# Altium footprint library Selex_PCBLib.PcbLib: 388 footprints (part 9 of 25)
Each footprint in its own frame and in the unit in brackets; x right, y up, seen from the top. Pads: shape width x height; smd on the part's side, far side on the other; paste and mask are expansions set on the pad; w line width, h text height; cw(c..) or ccw(c..) is an arc to the next point about the centre after c.
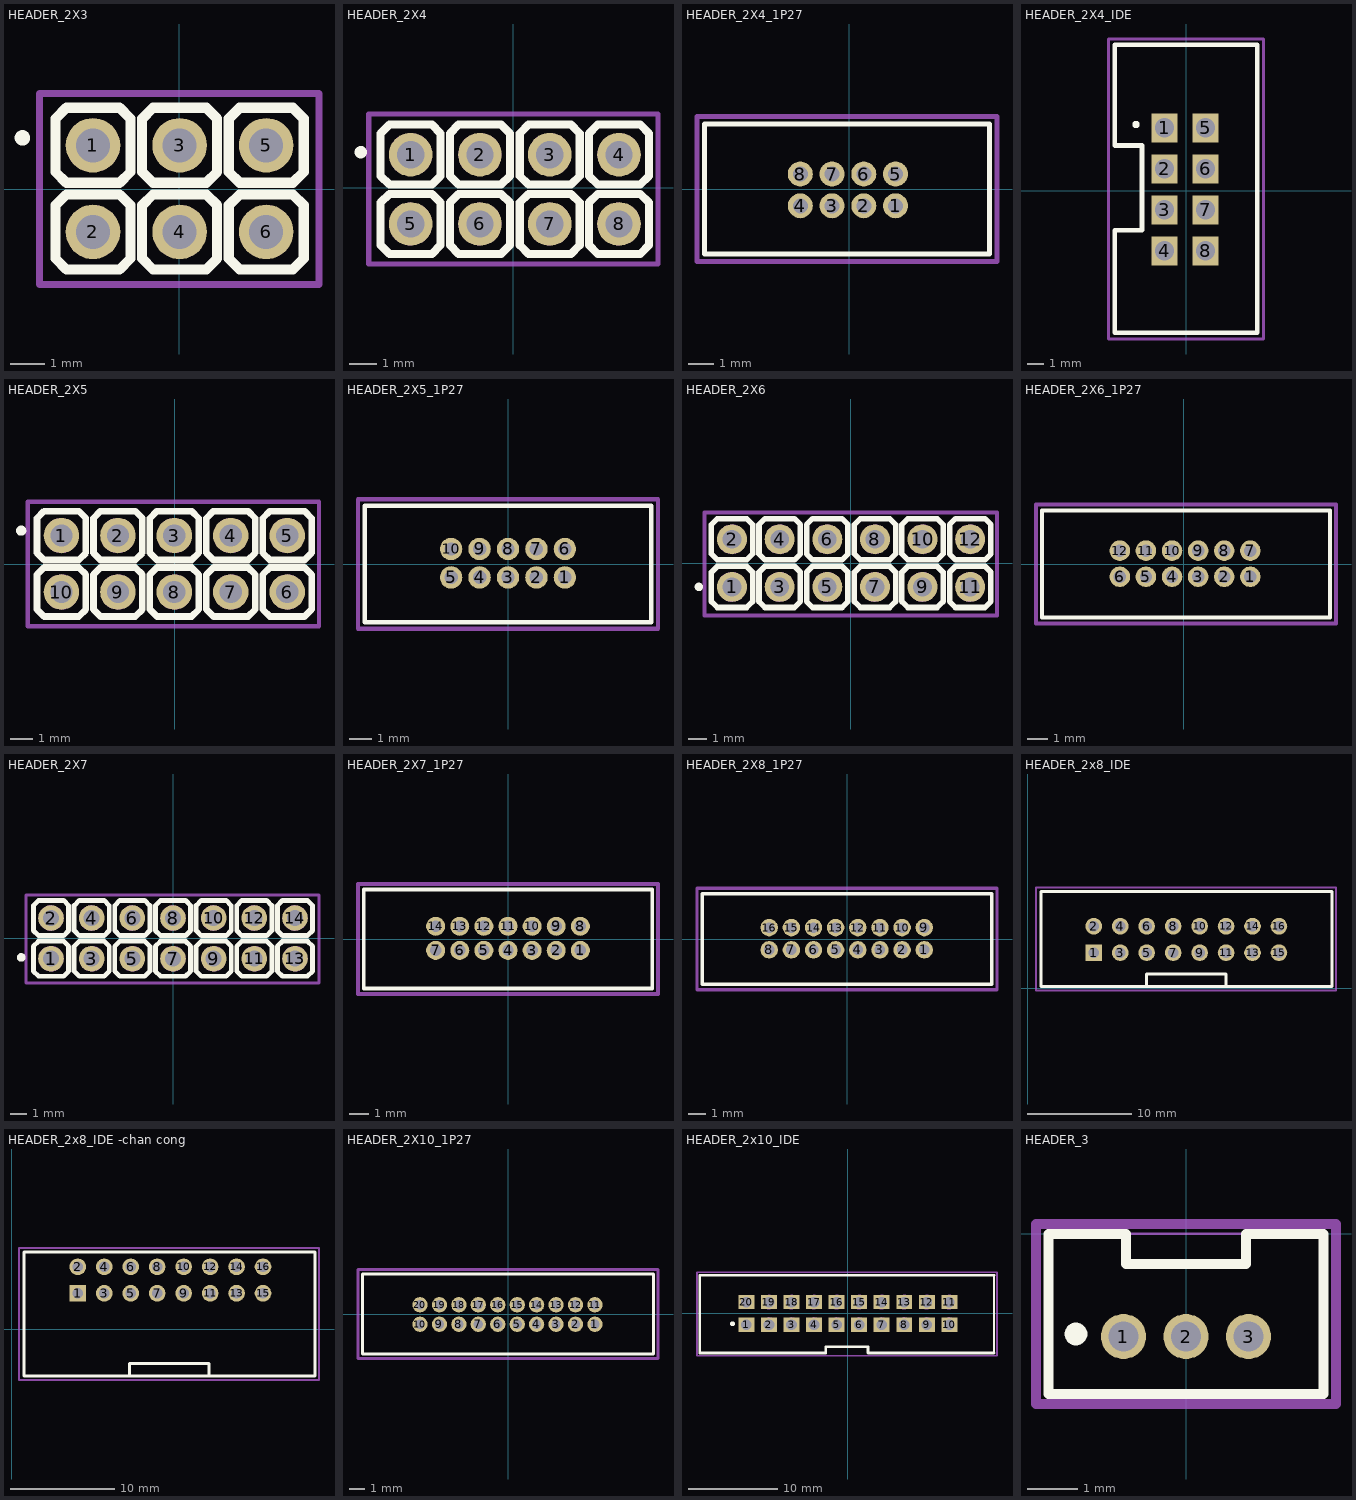
[diagram p8: the footprints below, top view; thin cyan lines are the x and y axes]

## HEADER_2X3 [mm] "2X3_2P54"
pads (6):
  round 1.6 hole 1 mask+0.1: 1(-2.53,1.28) 2(-2.53,-1.26) 3(0.01,1.28) 4(0.01,-1.26) 5(2.55,1.28) 6(2.55,-1.26)
Top Overlay:
  circle w0.254: c-4.6,1.5 r0.1
  lines w0.3: -1.09,0.5 -0.77,0.18 ; -1.09,0.5 -0.77,0.18 ; -1.09,0.5 -1.09,2.06 -0.77,2.38 0.79,2.38 1.11,2.06 1.11,0.5 0.79,0.18 -0.77,0.18 ; -3.63,-2.04 -3.63,-0.48 -3.31,-0.16 -1.75,-0.16 -1.43,-0.48 -1.43,-2.04 -1.75,-2.36 -3.31,-2.36 -3.63,-2.04 ; -3.63,0.5 -3.63,2.06 -3.31,2.38 -1.75,2.38 -1.43,2.06 -1.43,0.5 -1.75,0.18 -3.31,0.18 -3.63,0.5 ; -1.09,-2.04 -1.09,-0.48 -0.77,-0.16 0.79,-0.16 1.11,-0.48 1.11,-2.04 0.79,-2.36 -0.77,-2.36 -1.09,-2.04 ; 1.45,-2.04 1.45,-0.48 1.77,-0.16 3.33,-0.16 3.65,-0.48 3.65,-2.04 3.33,-2.36 1.77,-2.36 1.45,-2.04 ; 1.45,0.5 1.45,2.06 1.77,2.38 3.33,2.38 3.65,2.06 3.65,0.5 3.33,0.18 1.77,0.18 1.45,0.5
Mechanical 1:
  circle w0.05: c-2.53,1.28 r0.762
  circle w0.05: c0.01,1.28 r0.762
  circle w0.05: c-2.53,-1.26 r0.762
  circle w0.05: c0.01,-1.26 r0.762
  circle w0.05: c2.55,1.28 r0.762
  circle w0.05: c2.55,-1.26 r0.762
  lines w0.05: -1.09,0.5 -0.77,0.18 ; -1.09,0.5 -1.09,2.06 ; -1.09,0.5 -1.09,2.06 ; -1.09,0.5 -0.77,0.18 ; -1.09,2.06 -0.77,2.38 ; -1.09,2.06 -0.77,2.38 ; -0.77,0.18 0.79,0.18 ; -0.77,0.18 0.79,0.18 ; -0.77,2.38 0.79,2.38 ; -0.77,2.38 0.79,2.38 ; 0.79,0.18 1.11,0.5 ; 0.79,0.18 1.11,0.5 ; 0.79,2.38 1.11,2.06 ; 0.79,2.38 1.11,2.06 ; 1.11,0.5 1.11,2.06 ; 1.11,0.5 1.11,2.06 ; 1.45,0.5 1.45,2.06 ; 1.45,0.5 1.77,0.18 ; 1.45,0.5 1.77,0.18 ; 1.45,0.5 1.45,2.06 ; 1.45,2.06 1.77,2.38 ; 1.45,2.06 1.77,2.38 ; 1.77,0.18 3.33,0.18 ; 1.77,0.18 3.33,0.18 ; 1.77,2.38 3.33,2.38 ; 1.77,2.38 3.33,2.38 ; 3.33,0.18 3.65,0.5 ; 3.33,0.18 3.65,0.5 ; 3.33,2.38 3.65,2.06 ; 3.33,2.38 3.65,2.06 ; 3.65,0.5 3.65,2.06 ; 3.65,0.5 3.65,2.06 ; -3.63,-2.04 -3.31,-2.36 -1.75,-2.36 -1.43,-2.04 -1.43,-0.48 -1.75,-0.16 -3.31,-0.16 -3.63,-0.48 -3.63,-2.04 ; -3.63,0.5 -3.31,0.18 -1.75,0.18 -1.43,0.5 -1.43,2.06 -1.75,2.38 -3.31,2.38 -3.63,2.06 -3.63,0.5 ; -1.09,-2.04 -0.77,-2.36 0.79,-2.36 1.11,-2.04 1.11,-0.48 0.79,-0.16 -0.77,-0.16 -1.09,-0.48 -1.09,-2.04 ; 1.45,-2.04 1.77,-2.36 3.33,-2.36 3.65,-2.04 3.65,-0.48 3.33,-0.16 1.77,-0.16 1.45,-0.48 1.45,-2.04
  text "4" at -0.26,-1.64 h0.8
  text "2" at -2.76,-1.64 h0.8
  text "1" at -2.66,0.91 h0.8
  text "3" at -0.21,0.91 h0.8
  text "5" at 2.33,0.91 h0.8
  text "6" at 2.33,-1.63 h0.8
Mechanical 15:
  lines w0.2: -4.1,-2.8 4.1,-2.8 4.1,-1.325 4.1,2.8 -4.1,2.8 -4.1,-2.8
3D body "HEADER1.step": height 5.94, standoff -2.94, extent -3.83,-0.02 -1.29,2.52
3D body "HEADER1.step": height 5.94, standoff -2.94, extent -1.29,-0.02 1.25,2.52
3D body "HEADER1.step": height 5.94, standoff -2.94, extent -3.83,-2.56 -1.29,-0.02
3D body "HEADER1.step": height 5.94, standoff -2.94, extent -1.29,-2.56 1.25,-0.02
3D body "HEADER1.step": height 5.94, standoff -2.94, extent 1.25,-0.02 3.79,2.52
3D body "HEADER1.step": height 5.94, standoff -2.94, extent 1.25,-0.02 3.79,2.52
3D body "HEADER1.step": height 5.94, standoff -2.94, extent 1.25,-2.56 3.79,-0.02

## HEADER_2X4 [mm] "HEADER_2X4_2P54"
pads (8):
  round 1.6 hole 1 mask+0.1: 1(-3.77,1.21) 2(-1.23,1.21) 3(1.33,1.21) 4(3.87,1.21) 5(-3.77,-1.33) 6(-1.23,-1.33) 7(1.33,-1.33) 8(3.87,-1.33)
Top Overlay:
  circle w0.254: c-5.6,1.3 r0.1
  lines w0.3: -4.87,-2.11 -4.55,-2.43 -2.99,-2.43 -2.67,-2.11 -2.67,-0.55 -2.99,-0.23 -4.55,-0.23 -4.87,-0.55 -4.87,-2.11 ; -4.87,0.43 -4.55,0.11 -2.99,0.11 -2.67,0.43 -2.67,1.99 -2.99,2.31 -4.55,2.31 -4.87,1.99 -4.87,0.43 ; -2.33,-2.11 -2.01,-2.43 -0.45,-2.43 -0.13,-2.11 -0.13,-0.55 -0.45,-0.23 -2.01,-0.23 -2.33,-0.55 -2.33,-2.11 ; -2.33,0.43 -2.01,0.11 -0.45,0.11 -0.13,0.43 -0.13,1.99 -0.45,2.31 -2.01,2.31 -2.33,1.99 -2.33,0.43 ; 0.23,-2.11 0.55,-2.43 2.11,-2.43 2.43,-2.11 2.43,-0.55 2.11,-0.23 0.55,-0.23 0.23,-0.55 0.23,-2.11 ; 0.23,0.43 0.55,0.11 2.11,0.11 2.43,0.43 2.43,1.99 2.11,2.31 0.55,2.31 0.23,1.99 0.23,0.43 ; 2.77,-2.11 3.09,-2.43 4.65,-2.43 4.97,-2.11 4.97,-0.55 4.65,-0.23 3.09,-0.23 2.77,-0.55 2.77,-2.11 ; 2.77,0.43 3.09,0.11 4.65,0.11 4.97,0.43 4.97,1.99 4.65,2.31 3.09,2.31 2.77,1.99 2.77,0.43
Mechanical 1:
  circle w0.05: c-1.23,-1.33 r0.762
  circle w0.05: c-3.77,-1.33 r0.762
  circle w0.05: c-1.23,1.21 r0.762
  circle w0.05: c-3.77,1.21 r0.762
  circle w0.05: c3.87,-1.33 r0.762
  circle w0.05: c1.33,-1.33 r0.762
  circle w0.05: c3.87,1.21 r0.762
  circle w0.05: c1.33,1.21 r0.762
  lines w0.05: -4.87,-2.11 -4.87,-0.55 -4.55,-0.23 -2.99,-0.23 -2.67,-0.55 -2.67,-2.11 -2.99,-2.43 -4.55,-2.43 -4.87,-2.11 ; -4.87,0.43 -4.87,1.99 -4.55,2.31 -2.99,2.31 -2.67,1.99 -2.67,0.43 -2.99,0.11 -4.55,0.11 -4.87,0.43 ; -2.33,-2.11 -2.33,-0.55 -2.01,-0.23 -0.45,-0.23 -0.13,-0.55 -0.13,-2.11 -0.45,-2.43 -2.01,-2.43 -2.33,-2.11 ; -2.33,0.43 -2.33,1.99 -2.01,2.31 -0.45,2.31 -0.13,1.99 -0.13,0.43 -0.45,0.11 -2.01,0.11 -2.33,0.43 ; 0.23,-2.11 0.23,-0.55 0.55,-0.23 2.11,-0.23 2.43,-0.55 2.43,-2.11 2.11,-2.43 0.55,-2.43 0.23,-2.11 ; 0.23,0.43 0.23,1.99 0.55,2.31 2.11,2.31 2.43,1.99 2.43,0.43 2.11,0.11 0.55,0.11 0.23,0.43 ; 2.77,-2.11 2.77,-0.55 3.09,-0.23 4.65,-0.23 4.97,-0.55 4.97,-2.11 4.65,-2.43 3.09,-2.43 2.77,-2.11 ; 2.77,0.43 2.77,1.99 3.09,2.31 4.65,2.31 4.97,1.99 4.97,0.43 4.65,0.11 3.09,0.11 2.77,0.43
Mechanical 15:
  lines w0.2: -5.3,-2.8 5.3,-2.8 5.3,2.7 -5.3,2.7 -5.3,-2.8
3D body "HEADER1.step": height 5.94, standoff -2.94, extent -2.53,-2.63 0.01,-0.09
3D body "HEADER1.step": height 5.94, standoff -2.94, extent -5.07,-2.63 -2.53,-0.09
3D body "HEADER1.step": height 5.94, standoff -2.94, extent -2.53,-0.09 0.01,2.45
3D body "HEADER1.step": height 5.94, standoff -2.94, extent -5.07,-0.09 -2.53,2.45
3D body "HEADER1.step": height 5.94, standoff -2.94, extent 2.57,-2.63 5.11,-0.09
3D body "HEADER1.step": height 5.94, standoff -2.94, extent 0.03,-2.63 2.57,-0.09
3D body "HEADER1.step": height 5.94, standoff -2.94, extent 2.57,-0.09 5.11,2.45
3D body "HEADER1.step": height 5.94, standoff -2.94, extent 0.03,-0.09 2.57,2.45

## HEADER_2X4_1P27 [mm]
pads (8):
  round 1 hole 0.6: 1(1.84,-0.67) 2(0.57,-0.67) 3(-0.7,-0.67) 4(-1.97,-0.67) 5(1.84,0.6) 6(0.57,0.6) 7(-0.7,0.6) 8(-1.97,0.6)
Top Overlay:
  lines w0.2: -5.8,-2.6 5.6,-2.6 5.6,2.6 -5.8,2.6 -5.8,-2.6
Mechanical 15:
  lines w0.2: -6.1,-2.9 -6.1,2.9 5.9,2.9 5.9,-2.9 -6.1,-2.9

## HEADER_2X4_IDE [mm] "HEADER_2X4_IDE"
pads (8):
  rect 1.6x1.8 hole 1.2 mask+0.1: 1(-1.33,3.89) 2(-1.33,1.35) 3(-1.33,-1.19) 4(-1.33,-3.73) 5(1.21,3.89) 6(1.21,1.35) 7(1.21,-1.19) 8(1.21,-3.73)
Top Overlay:
  circle w0.254: c-3.1,4.1 r0.1
  lines w0.254: -4.42,-8.81 4.42,-8.81
  lines w0.3: -4.42,-8.81 -4.42,-2.46 -2.73,-2.46 -2.73,2.79 -4.42,2.79 -4.42,9.04 4.42,9.04 4.42,-8.81
Mechanical 1:
  circle w0.05: c-1.33,3.89 r0.762
  circle w0.05: c-1.33,1.35 r0.762
  circle w0.05: c-1.33,-1.19 r0.762
  circle w0.05: c-1.33,-3.73 r0.762
  circle w0.05: c1.21,-3.73 r0.762
  circle w0.05: c1.21,-1.19 r0.762
  circle w0.05: c1.21,1.35 r0.762
  circle w0.05: c1.21,3.89 r0.762
  text "7" at -1.53,-4.21 h0.8
  text "8" at 0.97,-4.11 h0.8
  text "6" at 0.97,-1.61 h0.8
  text "5" at -1.53,-1.61 h0.8
  text "1" at -1.43,3.49 h0.8
  text "2" at 0.97,3.49 h0.8
  text "3" at -1.63,0.99 h0.8
  text "4" at 0.87,0.99 h0.8
Mechanical 15:
  lines w0.2: -4.8,-9.2 4.8,-9.2 4.8,9.4 -4.8,9.4 -4.8,-9.2
3D body "DS1013-8S (IDC-8MS CONNFLY).stp": height 9, standoff -3.6, extent -4.48,-8.94 4.42,9.02

## HEADER_2X5 [mm] "HEADER_2X5_2P54"
pads (10):
  round 1.6 hole 1 mask+0.1: 1(-5.09,1.28) 2(-2.55,1.28) 3(-0.01,1.28) 4(2.53,1.28) 5(5.07,1.28) 6(5.07,-1.26) 7(2.53,-1.26) 8(-0.01,-1.26) 9(-2.55,-1.26) 10(-5.09,-1.26)
Top Overlay:
  circle w0.254: c-6.9,1.5 r0.1
  lines w0.3: -6.19,-2.04 -6.19,-0.48 -5.87,-0.16 -4.31,-0.16 -3.99,-0.48 -3.99,-2.04 -4.31,-2.36 -5.87,-2.36 -6.19,-2.04 ; -6.19,0.5 -5.87,0.18 -4.31,0.18 -3.99,0.5 -3.99,2.06 -4.31,2.38 -5.87,2.38 -6.19,2.06 -6.19,0.5 ; -3.65,-2.04 -3.65,-0.48 -3.33,-0.16 -1.77,-0.16 -1.45,-0.48 -1.45,-2.04 -1.77,-2.36 -3.33,-2.36 -3.65,-2.04 ; -3.65,0.5 -3.33,0.18 -1.77,0.18 -1.45,0.5 -1.45,2.06 -1.77,2.38 -3.33,2.38 -3.65,2.06 -3.65,0.5 ; -1.11,-2.04 -1.11,-0.48 -0.79,-0.16 0.77,-0.16 1.09,-0.48 1.09,-2.04 0.77,-2.36 -0.79,-2.36 -1.11,-2.04 ; -1.11,0.5 -0.79,0.18 0.77,0.18 1.09,0.5 1.09,2.06 0.77,2.38 -0.79,2.38 -1.11,2.06 -1.11,0.5 ; 1.43,-2.04 1.43,-0.48 1.75,-0.16 3.31,-0.16 3.63,-0.48 3.63,-2.04 3.31,-2.36 1.75,-2.36 1.43,-2.04 ; 1.43,0.5 1.75,0.18 3.31,0.18 3.63,0.5 3.63,2.06 3.31,2.38 1.75,2.38 1.43,2.06 1.43,0.5 ; 3.97,-2.04 3.97,-0.48 4.29,-0.16 5.85,-0.16 6.17,-0.48 6.17,-2.04 5.85,-2.36 4.29,-2.36 3.97,-2.04 ; 3.97,0.5 4.29,0.18 5.85,0.18 6.17,0.5 6.17,2.06 5.85,2.38 4.29,2.38 3.97,2.06 3.97,0.5
Mechanical 1:
  circle w0.05: c-5.09,-1.26 r0.762
  circle w0.05: c-2.55,-1.26 r0.762
  circle w0.05: c-0.01,-1.26 r0.762
  circle w0.05: c2.53,-1.26 r0.762
  circle w0.05: c5.07,-1.26 r0.762
  circle w0.05: c5.07,1.28 r0.762
  circle w0.05: c2.53,1.28 r0.762
  circle w0.05: c-0.01,1.28 r0.762
  circle w0.05: c-2.55,1.28 r0.762
  circle w0.05: c-5.09,1.28 r0.762
  lines w0.05: -6.19,-2.04 -5.87,-2.36 -4.31,-2.36 -3.99,-2.04 -3.99,-0.48 -4.31,-0.16 -5.87,-0.16 -6.19,-0.48 -6.19,-2.04 ; -6.19,0.5 -6.19,2.06 -5.87,2.38 -4.31,2.38 -3.99,2.06 -3.99,0.5 -4.31,0.18 -5.87,0.18 -6.19,0.5 ; -3.65,-2.04 -3.33,-2.36 -1.77,-2.36 -1.45,-2.04 -1.45,-0.48 -1.77,-0.16 -3.33,-0.16 -3.65,-0.48 -3.65,-2.04 ; -3.65,0.5 -3.65,2.06 -3.33,2.38 -1.77,2.38 -1.45,2.06 -1.45,0.5 -1.77,0.18 -3.33,0.18 -3.65,0.5 ; -1.11,-2.04 -0.79,-2.36 0.77,-2.36 1.09,-2.04 1.09,-0.48 0.77,-0.16 -0.79,-0.16 -1.11,-0.48 -1.11,-2.04 ; -1.11,0.5 -1.11,2.06 -0.79,2.38 0.77,2.38 1.09,2.06 1.09,0.5 0.77,0.18 -0.79,0.18 -1.11,0.5 ; 1.43,-2.04 1.75,-2.36 3.31,-2.36 3.63,-2.04 3.63,-0.48 3.31,-0.16 1.75,-0.16 1.43,-0.48 1.43,-2.04 ; 1.43,0.5 1.43,2.06 1.75,2.38 3.31,2.38 3.63,2.06 3.63,0.5 3.31,0.18 1.75,0.18 1.43,0.5 ; 3.97,-2.04 4.29,-2.36 5.85,-2.36 6.17,-2.04 6.17,-0.48 5.85,-0.16 4.29,-0.16 3.97,-0.48 3.97,-2.04 ; 3.97,0.5 3.97,2.06 4.29,2.38 5.85,2.38 6.17,2.06 6.17,0.5 5.85,0.18 4.29,0.18 3.97,0.5
  text "7" at 2.19,-1.66 h0.8
  text "8" at -0.21,-1.66 h0.8
  text "9" at -2.79,-1.66 h0.8
  text "10" at -5.59,-1.52 h0.6
  text "6" at 4.81,-1.66 h0.8
  text "5" at 4.81,0.88 h0.8
  text "1" at -5.19,0.88 h0.8
  text "2" at -2.79,0.88 h0.8
  text "3" at -0.21,0.88 h0.8
  text "4" at 2.19,0.88 h0.8
Mechanical 15:
  lines w0.2: -6.6,-2.8 6.5,-2.8 6.5,2.8 -6.6,2.8 -6.6,-2.8
3D body "HEADER1.step": height 5.94, standoff -2.94, extent -6.39,-2.56 -3.85,-0.02
3D body "HEADER1.step": height 5.94, standoff -2.94, extent -3.85,-2.56 -1.31,-0.02
3D body "HEADER1.step": height 5.94, standoff -2.94, extent -1.31,-2.56 1.23,-0.02
3D body "HEADER1.step": height 5.94, standoff -2.94, extent 1.23,-2.56 3.77,-0.02
3D body "HEADER1.step": height 5.94, standoff -2.94, extent 3.77,-2.56 6.31,-0.02
3D body "HEADER1.step": height 5.94, standoff -2.94, extent 3.77,-0.02 6.31,2.52
3D body "HEADER1.step": height 5.94, standoff -2.94, extent 1.23,-0.02 3.77,2.52
3D body "HEADER1.step": height 5.94, standoff -2.94, extent -1.31,-0.02 1.23,2.52
3D body "HEADER1.step": height 5.94, standoff -2.94, extent -3.85,-0.02 -1.31,2.52
3D body "HEADER1.step": height 5.94, standoff -2.94, extent -6.39,-0.02 -3.85,2.52

## HEADER_2X5_1P27 [mm]
pads (10):
  round 1 hole 0.6: 1(2.54,-0.6) 2(1.27,-0.6) 3(0,-0.6) 4(-1.27,-0.6) 5(-2.54,-0.6) 6(2.54,0.67) 7(1.27,0.67) 8(0,0.67) 9(-1.27,0.67) 10(-2.54,0.67)
Top Overlay:
  lines w0.2: -6.4,-2.6 6.4,-2.6 6.4,2.6 -6.4,2.6 -6.4,-2.6
Mechanical 15:
  lines w0.2: -6.7,-2.9 -6.7,2.9 6.7,2.9 6.7,-2.9 -6.7,-2.9

## HEADER_2X6 [mm] "HEADER_2X6_2P54"
pads (12):
  round 1.6 hole 1 mask+0.1: 1(-6.33,-1.27) 2(-6.33,1.27) 3(-3.79,-1.27) 4(-3.79,1.27) 5(-1.25,-1.27) 6(-1.25,1.27) 7(1.29,-1.27) 8(1.29,1.27) 9(3.83,-1.27) 10(3.83,1.27) 11(6.37,-1.27) 12(6.37,1.27)
Top Overlay:
  circle w0.254: c-8.1,-1.27 r0.1
  lines w0.3: -7.43,-2.05 -7.11,-2.37 -5.55,-2.37 -5.23,-2.05 -5.23,-0.49 -5.55,-0.17 -7.11,-0.17 -7.43,-0.49 -7.43,-2.05 ; -7.43,0.49 -7.43,2.05 -7.11,2.37 -5.55,2.37 -5.23,2.05 -5.23,0.49 -5.55,0.17 -7.11,0.17 -7.43,0.49 ; -4.89,-2.05 -4.57,-2.37 -3.01,-2.37 -2.69,-2.05 -2.69,-0.49 -3.01,-0.17 -4.57,-0.17 -4.89,-0.49 -4.89,-2.05 ; -4.89,0.49 -4.89,2.05 -4.57,2.37 -3.01,2.37 -2.69,2.05 -2.69,0.49 -3.01,0.17 -4.57,0.17 -4.89,0.49 ; -2.35,-2.05 -2.03,-2.37 -0.47,-2.37 -0.15,-2.05 -0.15,-0.49 -0.47,-0.17 -2.03,-0.17 -2.35,-0.49 -2.35,-2.05 ; -2.35,0.49 -2.35,2.05 -2.03,2.37 -0.47,2.37 -0.15,2.05 -0.15,0.49 -0.47,0.17 -2.03,0.17 -2.35,0.49 ; 0.19,-2.05 0.51,-2.37 2.07,-2.37 2.39,-2.05 2.39,-0.49 2.07,-0.17 0.51,-0.17 0.19,-0.49 0.19,-2.05 ; 0.19,0.49 0.19,2.05 0.51,2.37 2.07,2.37 2.39,2.05 2.39,0.49 2.07,0.17 0.51,0.17 0.19,0.49 ; 2.73,-2.05 3.05,-2.37 4.61,-2.37 4.93,-2.05 4.93,-0.49 4.61,-0.17 3.05,-0.17 2.73,-0.49 2.73,-2.05 ; 2.73,0.49 2.73,2.05 3.05,2.37 4.61,2.37 4.93,2.05 4.93,0.49 4.61,0.17 3.05,0.17 2.73,0.49 ; 5.27,-2.05 5.59,-2.37 7.15,-2.37 7.47,-2.05 7.47,-0.49 7.15,-0.17 5.59,-0.17 5.27,-0.49 5.27,-2.05 ; 5.27,0.49 5.27,2.05 5.59,2.37 7.15,2.37 7.47,2.05 7.47,0.49 7.15,0.17 5.59,0.17 5.27,0.49
Mechanical 1:
  circle w0.05: c6.37,1.27 r0.762
  circle w0.05: c3.83,1.27 r0.762
  circle w0.05: c1.29,1.27 r0.762
  circle w0.05: c-1.25,1.27 r0.762
  circle w0.05: c-3.79,1.27 r0.762
  circle w0.05: c-6.33,1.27 r0.762
  circle w0.05: c-6.33,-1.27 r0.762
  circle w0.05: c-3.79,-1.27 r0.762
  circle w0.05: c-1.25,-1.27 r0.762
  circle w0.05: c1.29,-1.27 r0.762
  circle w0.05: c3.83,-1.27 r0.762
  circle w0.05: c6.37,-1.27 r0.762
  lines w0.05: -7.43,-2.05 -7.43,-0.49 -7.11,-0.17 -5.55,-0.17 -5.23,-0.49 -5.23,-2.05 -5.55,-2.37 -7.11,-2.37 -7.43,-2.05 ; -7.43,0.49 -7.11,0.17 -5.55,0.17 -5.23,0.49 -5.23,2.05 -5.55,2.37 -7.11,2.37 -7.43,2.05 -7.43,0.49 ; -4.89,-2.05 -4.89,-0.49 -4.57,-0.17 -3.01,-0.17 -2.69,-0.49 -2.69,-2.05 -3.01,-2.37 -4.57,-2.37 -4.89,-2.05 ; -4.89,0.49 -4.57,0.17 -3.01,0.17 -2.69,0.49 -2.69,2.05 -3.01,2.37 -4.57,2.37 -4.89,2.05 -4.89,0.49 ; -2.35,-2.05 -2.35,-0.49 -2.03,-0.17 -0.47,-0.17 -0.15,-0.49 -0.15,-2.05 -0.47,-2.37 -2.03,-2.37 -2.35,-2.05 ; -2.35,0.49 -2.03,0.17 -0.47,0.17 -0.15,0.49 -0.15,2.05 -0.47,2.37 -2.03,2.37 -2.35,2.05 -2.35,0.49 ; 0.19,-2.05 0.19,-0.49 0.51,-0.17 2.07,-0.17 2.39,-0.49 2.39,-2.05 2.07,-2.37 0.51,-2.37 0.19,-2.05 ; 0.19,0.49 0.51,0.17 2.07,0.17 2.39,0.49 2.39,2.05 2.07,2.37 0.51,2.37 0.19,2.05 0.19,0.49 ; 2.73,-2.05 2.73,-0.49 3.05,-0.17 4.61,-0.17 4.93,-0.49 4.93,-2.05 4.61,-2.37 3.05,-2.37 2.73,-2.05 ; 2.73,0.49 3.05,0.17 4.61,0.17 4.93,0.49 4.93,2.05 4.61,2.37 3.05,2.37 2.73,2.05 2.73,0.49 ; 5.27,-2.05 5.27,-0.49 5.59,-0.17 7.15,-0.17 7.47,-0.49 7.47,-2.05 7.15,-2.37 5.59,-2.37 5.27,-2.05 ; 5.27,0.49 5.59,0.17 7.15,0.17 7.47,0.49 7.47,2.05 7.15,2.37 5.59,2.37 5.27,2.05 5.27,0.49
  text "10" at 3.27,0.87 h0.8
  text "2" at -6.45,0.87 h0.8
  text "4" at -4.05,0.87 h0.8
  text "6" at -1.47,0.87 h0.8
  text "8" at 1.03,0.87 h0.8
  text "12" at 5.77,0.87 h0.8
  text "11" at 5.87,-1.67 h0.8
  text "7" at 1.03,-1.67 h0.8
  text "5" at -1.47,-1.67 h0.8
  text "3" at -4.05,-1.67 h0.8
  text "1" at -6.45,-1.67 h0.8
  text "9" at 3.63,-1.67 h0.8
Mechanical 15:
  lines w0.2: -7.8,-2.8 7.8,-2.8 7.8,2.7 -7.8,2.7 -7.8,-2.8
3D body "HEADER1.step": height 5.94, standoff -2.94, extent -7.63,-0.03 -5.09,2.51
3D body "HEADER1.step": height 5.94, standoff -2.94, extent -5.09,-0.03 -2.55,2.51
3D body "HEADER1.step": height 5.94, standoff -2.94, extent -7.63,-2.57 -5.09,-0.03
3D body "HEADER1.step": height 5.94, standoff -2.94, extent -5.09,-2.57 -2.55,-0.03
3D body "HEADER1.step": height 5.94, standoff -2.94, extent -2.55,-0.03 -0.01,2.51
3D body "HEADER1.step": height 5.94, standoff -2.94, extent -2.55,-0.03 -0.01,2.51
3D body "HEADER1.step": height 5.94, standoff -2.94, extent -2.55,-2.57 -0.01,-0.03
3D body "HEADER1.step": height 5.94, standoff -2.94, extent -0.01,-0.03 2.53,2.51
3D body "HEADER1.step": height 5.94, standoff -2.94, extent 2.53,-0.03 5.07,2.51
3D body "HEADER1.step": height 5.94, standoff -2.94, extent -0.01,-2.57 2.53,-0.03
3D body "HEADER1.step": height 5.94, standoff -2.94, extent 2.53,-2.57 5.07,-0.03
3D body "HEADER1.step": height 5.94, standoff -2.94, extent 5.07,-0.03 7.61,2.51
3D body "HEADER1.step": height 5.94, standoff -2.94, extent 5.07,-0.03 7.61,2.51
3D body "HEADER1.step": height 5.94, standoff -2.94, extent 5.07,-2.57 7.61,-0.03

## HEADER_2X6_1P27 [mm]
pads (12):
  round 1 hole 0.6: 1(3.23,-0.62) 2(1.96,-0.62) 3(0.69,-0.62) 4(-0.58,-0.62) 5(-1.85,-0.62) 6(-3.12,-0.62) 7(3.23,0.65) 8(1.96,0.65) 9(0.69,0.65) 10(-0.58,0.65) 11(-1.85,0.65) 12(-3.12,0.65)
Top Overlay:
  lines w0.2: -6.9,-2.6 7.1,-2.6 7.1,2.6 -6.9,2.6 -6.9,-2.6
Mechanical 15:
  lines w0.2: -7.2,-2.9 -7.2,2.9 7.4,2.9 7.4,-2.9 -7.2,-2.9

## HEADER_2X7 [mm] "HEADER_2X7_2P54"
pads (14):
  round 1.6 hole 1 mask+0.1: 1(-7.64,-1.28) 2(-7.64,1.26) 3(-5.1,-1.28) 4(-5.1,1.26) 5(-2.56,-1.28) 6(-2.56,1.26) 7(-0.02,-1.28) 8(-0.02,1.26) 9(2.52,-1.28) 10(2.52,1.26) 11(5.06,-1.28) 12(5.06,1.26) 13(7.6,-1.28) 14(7.6,1.26)
Top Overlay:
  circle w0.254: c-9.5,-1.2 r0.141
  lines w0.3: -8.74,-2.06 -8.74,-0.5 -8.42,-0.18 -6.86,-0.18 -6.54,-0.5 -6.54,-2.06 -6.86,-2.38 -8.42,-2.38 -8.74,-2.06 ; -8.74,0.48 -8.42,0.16 -6.86,0.16 -6.54,0.48 -6.54,2.04 -6.86,2.36 -8.42,2.36 -8.74,2.04 -8.74,0.48 ; -6.2,-2.06 -6.2,-0.5 -5.88,-0.18 -4.32,-0.18 -4,-0.5 -4,-2.06 -4.32,-2.38 -5.88,-2.38 -6.2,-2.06 ; -6.2,0.48 -5.88,0.16 -4.32,0.16 -4,0.48 -4,2.04 -4.32,2.36 -5.88,2.36 -6.2,2.04 -6.2,0.48 ; -3.66,-2.06 -3.66,-0.5 -3.34,-0.18 -1.78,-0.18 -1.46,-0.5 -1.46,-2.06 -1.78,-2.38 -3.34,-2.38 -3.66,-2.06 ; -3.66,0.48 -3.34,0.16 -1.78,0.16 -1.46,0.48 -1.46,2.04 -1.78,2.36 -3.34,2.36 -3.66,2.04 -3.66,0.48 ; -1.12,-2.06 -1.12,-0.5 -0.8,-0.18 0.76,-0.18 1.08,-0.5 1.08,-2.06 0.76,-2.38 -0.8,-2.38 -1.12,-2.06 ; -1.12,0.48 -0.8,0.16 0.76,0.16 1.08,0.48 1.08,2.04 0.76,2.36 -0.8,2.36 -1.12,2.04 -1.12,0.48 ; 1.42,-2.06 1.42,-0.5 1.74,-0.18 3.3,-0.18 3.62,-0.5 3.62,-2.06 3.3,-2.38 1.74,-2.38 1.42,-2.06 ; 1.42,0.48 1.74,0.16 3.3,0.16 3.62,0.48 3.62,2.04 3.3,2.36 1.74,2.36 1.42,2.04 1.42,0.48 ; 3.96,-2.06 3.96,-0.5 4.28,-0.18 5.84,-0.18 6.16,-0.5 6.16,-2.06 5.84,-2.38 4.28,-2.38 3.96,-2.06 ; 3.96,0.48 4.28,0.16 5.84,0.16 6.16,0.48 6.16,2.04 5.84,2.36 4.28,2.36 3.96,2.04 3.96,0.48 ; 6.5,-2.06 6.5,-0.5 6.82,-0.18 8.38,-0.18 8.7,-0.5 8.7,-2.06 8.38,-2.38 6.82,-2.38 6.5,-2.06 ; 6.5,0.48 6.82,0.16 8.38,0.16 8.7,0.48 8.7,2.04 8.38,2.36 6.82,2.36 6.5,2.04 6.5,0.48
Mechanical 1:
  circle w0.05: c7.6,-1.28 r0.762
  circle w0.05: c5.06,-1.28 r0.762
  circle w0.05: c2.52,-1.28 r0.762
  circle w0.05: c-0.02,-1.28 r0.762
  circle w0.05: c-2.56,-1.28 r0.762
  circle w0.05: c-5.1,-1.28 r0.762
  circle w0.05: c-7.64,-1.28 r0.762
  circle w0.05: c-7.64,1.26 r0.762
  circle w0.05: c-5.1,1.26 r0.762
  circle w0.05: c-2.56,1.26 r0.762
  circle w0.05: c-0.02,1.26 r0.762
  circle w0.05: c2.52,1.26 r0.762
  circle w0.05: c5.06,1.26 r0.762
  circle w0.05: c7.6,1.26 r0.762
  lines w0.05: -8.74,-2.06 -8.42,-2.38 -6.86,-2.38 -6.54,-2.06 -6.54,-0.5 -6.86,-0.18 -8.42,-0.18 -8.74,-0.5 -8.74,-2.06 ; -8.74,0.48 -8.74,2.04 -8.42,2.36 -6.86,2.36 -6.54,2.04 -6.54,0.48 -6.86,0.16 -8.42,0.16 -8.74,0.48 ; -6.2,-2.06 -5.88,-2.38 -4.32,-2.38 -4,-2.06 -4,-0.5 -4.32,-0.18 -5.88,-0.18 -6.2,-0.5 -6.2,-2.06 ; -6.2,0.48 -6.2,2.04 -5.88,2.36 -4.32,2.36 -4,2.04 -4,0.48 -4.32,0.16 -5.88,0.16 -6.2,0.48 ; -3.66,-2.06 -3.34,-2.38 -1.78,-2.38 -1.46,-2.06 -1.46,-0.5 -1.78,-0.18 -3.34,-0.18 -3.66,-0.5 -3.66,-2.06 ; -3.66,0.48 -3.66,2.04 -3.34,2.36 -1.78,2.36 -1.46,2.04 -1.46,0.48 -1.78,0.16 -3.34,0.16 -3.66,0.48 ; -1.12,-2.06 -0.8,-2.38 0.76,-2.38 1.08,-2.06 1.08,-0.5 0.76,-0.18 -0.8,-0.18 -1.12,-0.5 -1.12,-2.06 ; -1.12,0.48 -1.12,2.04 -0.8,2.36 0.76,2.36 1.08,2.04 1.08,0.48 0.76,0.16 -0.8,0.16 -1.12,0.48 ; 1.42,-2.06 1.74,-2.38 3.3,-2.38 3.62,-2.06 3.62,-0.5 3.3,-0.18 1.74,-0.18 1.42,-0.5 1.42,-2.06 ; 1.42,0.48 1.42,2.04 1.74,2.36 3.3,2.36 3.62,2.04 3.62,0.48 3.3,0.16 1.74,0.16 1.42,0.48 ; 3.96,-2.06 4.28,-2.38 5.84,-2.38 6.16,-2.06 6.16,-0.5 5.84,-0.18 4.28,-0.18 3.96,-0.5 3.96,-2.06 ; 3.96,0.48 3.96,2.04 4.28,2.36 5.84,2.36 6.16,2.04 6.16,0.48 5.84,0.16 4.28,0.16 3.96,0.48 ; 6.5,-2.06 6.82,-2.38 8.38,-2.38 8.7,-2.06 8.7,-0.5 8.38,-0.18 6.82,-0.18 6.5,-0.5 6.5,-2.06 ; 6.5,0.48 6.5,2.04 6.82,2.36 8.38,2.36 8.7,2.04 8.7,0.48 8.38,0.16 6.82,0.16 6.5,0.48
  text "13" at 6.96,-1.68 h0.8
  text "9" at 2.32,-1.68 h0.8
  text "1" at -7.76,-1.68 h0.8
  text "3" at -5.36,-1.68 h0.8
  text "5" at -2.78,-1.68 h0.8
  text "7" at -0.28,-1.68 h0.8
  text "11" at 4.56,-1.68 h0.8
  text "12" at 4.46,0.86 h0.8
  text "8" at -0.28,0.86 h0.8
  text "6" at -2.78,0.86 h0.8
  text "4" at -5.36,0.86 h0.8
  text "2" at -7.76,0.86 h0.8
  text "10" at 1.96,0.86 h0.8
  text "14" at 6.96,0.86 h0.8
Mechanical 15:
  lines w0.2: -9.2,-2.8 -9.2,2.7 9.1,2.7 9.1,-2.8 -9.2,-2.8
3D body "HEADER1.step": height 5.94, standoff -2.94, extent 6.3,-2.58 8.84,-0.04
3D body "HEADER1.step": height 5.94, standoff -2.94, extent 6.3,-0.04 8.84,2.5
3D body "HEADER1.step": height 5.94, standoff -2.94, extent 3.76,-2.58 6.3,-0.04
3D body "HEADER1.step": height 5.94, standoff -2.94, extent 3.76,-0.04 6.3,2.5
3D body "HEADER1.step": height 5.94, standoff -2.94, extent 3.76,-0.04 6.3,2.5
3D body "HEADER1.step": height 5.94, standoff -2.94, extent 1.22,-2.58 3.76,-0.04
3D body "HEADER1.step": height 5.94, standoff -2.94, extent -1.32,-2.58 1.22,-0.04
3D body "HEADER1.step": height 5.94, standoff -2.94, extent 1.22,-0.04 3.76,2.5
3D body "HEADER1.step": height 5.94, standoff -2.94, extent -1.32,-0.04 1.22,2.5
3D body "HEADER1.step": height 5.94, standoff -2.94, extent -3.86,-2.58 -1.32,-0.04
3D body "HEADER1.step": height 5.94, standoff -2.94, extent -3.86,-0.04 -1.32,2.5
3D body "HEADER1.step": height 5.94, standoff -2.94, extent -3.86,-0.04 -1.32,2.5
3D body "HEADER1.step": height 5.94, standoff -2.94, extent -6.4,-2.58 -3.86,-0.04
3D body "HEADER1.step": height 5.94, standoff -2.94, extent -8.94,-2.58 -6.4,-0.04
3D body "HEADER1.step": height 5.94, standoff -2.94, extent -6.4,-0.04 -3.86,2.5
3D body "HEADER1.step": height 5.94, standoff -2.94, extent -8.94,-0.04 -6.4,2.5

## HEADER_2X7_1P27 [mm]
pads (14):
  round 1 hole 0.6: 1(3.81,-0.6) 2(2.54,-0.6) 3(1.27,-0.6) 4(0,-0.6) 5(-1.27,-0.6) 6(-2.54,-0.6) 7(-3.81,-0.6) 8(3.81,0.67) 9(2.54,0.67) 10(1.27,0.67) 11(0,0.67) 12(-1.27,0.67) 13(-2.54,0.67) 14(-3.81,0.67)
Top Overlay:
  lines w0.2: -7.6,-2.6 7.6,-2.6 7.6,2.6 -7.6,2.6 -7.6,-2.6
Mechanical 15:
  lines w0.2: -7.9,-2.9 -7.9,2.9 7.9,2.9 7.9,-2.9 -7.9,-2.9

## HEADER_2X8_1P27 [mm]
pads (16):
  round 1 hole 0.6: 1(4.43,-0.62) 2(3.16,-0.62) 3(1.89,-0.62) 4(0.62,-0.62) 5(-0.65,-0.62) 6(-1.92,-0.62) 7(-3.19,-0.62) 8(-4.46,-0.62) 9(4.43,0.65) 10(3.16,0.65) 11(1.89,0.65) 12(0.62,0.65) 13(-0.65,0.65) 14(-1.92,0.65) 15(-3.19,0.65) 16(-4.46,0.65)
Top Overlay:
  lines w0.2: -8.3,-2.6 -8.3,2.6 8.3,2.6 8.3,-2.6 -8.3,-2.6
Mechanical 15:
  lines w0.2: -8.6,-2.9 8.6,-2.9 8.6,2.9 -8.6,2.9 -8.6,-2.9

## HEADER_2x8_IDE [mm] "HEADER_2x8_IDE"
pads (16):
  rect 1.6x1.6 hole 1.02: 1(6.345,3.438)
  round 1.6 hole 1.02: 2(6.345,5.978) 3(8.885,3.438) 4(8.885,5.978) 5(11.425,3.438) 6(11.425,5.978) 7(13.965,3.438) 8(13.965,5.978) 9(16.505,3.438) 10(16.505,5.978)
  round 1.6 hole 1.02 paste+0 mask+0.076: 11(19.045,3.438) 12(19.045,5.978) 13(21.585,3.438) 14(21.585,5.978) 15(24.125,3.438) 16(24.125,5.978)
Top Overlay:
  lines w0.3: 11.425,0.208 11.425,1.406 19.045,1.406 19.045,0.208 ; 1.265,0.208 29.205,0.208 29.205,9.308 1.265,9.308 1.265,0.208
Mechanical 15:
  lines w0.2: 0.8,-0.2 0.8,9.7 29.6,9.7 29.6,-0.2 0.8,-0.2

## HEADER_2x8_IDE -chan cong [mm] "HEADER_2x8_IDE"
pads (16):
  rect 1.6x1.6 hole 1.02: 1(6.345,3.438)
  round 1.6 hole 1.02: 2(6.345,5.978) 3(8.885,3.438) 4(8.885,5.978) 5(11.425,3.438) 6(11.425,5.978) 7(13.965,3.438) 8(13.965,5.978) 9(16.505,3.438) 10(16.505,5.978)
  round 1.6 hole 1.02 paste+0 mask+0.076: 11(19.045,3.438) 12(19.045,5.978) 13(21.585,3.438) 14(21.585,5.978) 15(24.125,3.438) 16(24.125,5.978)
Top Overlay:
  lines w0.3: 11.325,-4.492 11.325,-3.294 18.945,-3.294 18.945,-4.492 ; 1.165,-4.492 29.105,-4.492 29.105,-1.692 29.105,7.408 1.165,7.408 1.165,-1.692 1.165,-4.492
Mechanical 7:
  lines w0.2: 0.7,-4.9 0.7,-1.9 ; 29.5,-4.9 29.5,-2.1
Mechanical 15:
  lines w0.2: 0.7,-4.9 29.5,-4.9 ; 0.7,-2.1 0.7,7.8 29.5,7.8 29.5,-2.1

## HEADER_2X10_1P27 [mm]
pads (20):
  round 1 hole 0.6: 1(5.68,-0.67) 2(4.41,-0.67) 3(3.14,-0.67) 4(1.87,-0.67) 5(0.6,-0.67) 6(-0.67,-0.67) 7(-1.94,-0.67) 8(-3.21,-0.67) 9(-4.48,-0.67) 10(-5.75,-0.67) 11(5.68,0.6) 12(4.41,0.6) 13(3.14,0.6) 14(1.87,0.6) 15(0.6,0.6) 16(-0.67,0.6) 17(-1.94,0.6) 18(-3.21,0.6) 19(-4.48,0.6) 20(-5.75,0.6)
Top Overlay:
  lines w0.2: -9.5,-2.6 9.5,-2.6 9.5,2.6 -9.5,2.6 -9.5,-2.6
Mechanical 15:
  lines w0.2: -9.8,-2.9 -9.8,2.9 9.8,2.9 9.8,-2.9 -9.8,-2.9

## HEADER_2x10_IDE [mm]
pads (20):
  rect 1.8x1.6 hole 1.2 mask+0.1: 1(-11.44,-1.31) 2(-8.89,-1.3) 3(-6.35,-1.3) 4(-3.81,-1.3) 5(-1.27,-1.3) 6(1.27,-1.3) 7(3.81,-1.3) 8(6.35,-1.3) 9(8.89,-1.3) 10(11.43,-1.3) 11(11.43,1.24) 12(8.89,1.24) 13(6.35,1.24) 14(3.81,1.24) 15(1.27,1.24) 16(-1.27,1.24) 17(-3.81,1.24) 18(-6.35,1.24) 19(-8.89,1.24) 20(-11.44,1.24)
Top Overlay:
  circle w0.254: c-13,-1.2 r0.141
  lines w0.254: 16.46,-4.5 16.46,4.26
  lines w0.3: 16.46,-4.5 2.26,-4.5 2.26,-3.8 -2.49,-3.8 -2.49,-4.5 -16.69,-4.5 -16.69,4.26 16.46,4.26
Mechanical 1:
  circle w0.05: c-8.89,1.24 r0.762
  circle w0.05: c-6.35,1.24 r0.762
  circle w0.05: c-3.81,1.24 r0.762
  circle w0.05: c-1.27,1.24 r0.762
  circle w0.05: c1.27,1.24 r0.762
  circle w0.05: c1.27,-1.3 r0.762
  circle w0.05: c-1.27,-1.3 r0.762
  circle w0.05: c-3.81,-1.3 r0.762
  circle w0.05: c-6.35,-1.3 r0.762
  circle w0.05: c-8.89,-1.3 r0.762
  circle w0.05: c3.81,1.24 r0.762
  circle w0.05: c6.35,1.24 r0.762
  circle w0.05: c8.89,1.24 r0.762
  circle w0.05: c11.43,1.24 r0.762
  circle w0.05: c11.43,-1.3 r0.762
  circle w0.05: c8.89,-1.3 r0.762
  circle w0.05: c6.35,-1.3 r0.762
  circle w0.05: c3.81,-1.3 r0.762
  text "4" at -5.99,0.9 h0.8
  text "3" at -5.99,-1.6 h0.8
  text "2" at -8.49,1 h0.8
  text "1" at -8.49,-1.4 h0.8
  text "5" at -3.39,-1.5 h0.8
  text "6" at -3.39,1 h0.8
  text "9" at 1.71,-1.6 h0.8
  text "8" at -0.89,1 h0.8
  text "7" at -0.79,-1.5 h0.8
  text "10" at 1.61,0.8 h0.6
  text "4" at 6.71,0.9 h0.8
  text "3" at 6.71,-1.6 h0.8
  text "2" at 4.21,1 h0.8
  text "1" at 4.21,-1.4 h0.8
  text "5" at 9.31,-1.5 h0.8
  text "6" at 9.31,1 h0.8
  text "8" at 11.81,1 h0.8
  text "7" at 11.91,-1.5 h0.8
Mechanical 15:
  lines w0.2: 16.8,-4.8 -17,-4.8 -17,4.6 16.8,4.6
  lines w0.21: 16.8,-4.8 16.8,4.6
3D body "DS1013-20S (IDC-20MS CONNFLY).stp": height 9, standoff -3.6, extent -16.59,-4.55 16.61,4.35

## HEADER_3 [mm] "HEADER_3_1p25"
pads (3):
  round 0.9 hole 0.6 mask+0.05: 1(-1.25,-2.05) 2(0,-2.05) 3(1.25,-2.05)
Top Overlay:
  circle w0.254: c-2.2,-2 r0.1
  lines w0.2: -2.75,-3.2 -2.75,0 -1.2,0 -1.2,-0.6 1.2,-0.6 1.2,0 2.75,0 2.75,-3.2 -2.75,-3.2
Mechanical 1:
  lines w0.05: -2.75,-3.2 -2.75,0 2.75,0 2.75,-3.2 -2.75,-3.2
Mechanical 15:
  lines w0.2: -3,-3.4 -3,0.2 3,0.2 3,-3.4 -3,-3.4
3D body "47568.stp": height 4.27, standoff -2.33, extent -2.7,-3.3 2.7,0.1